# Altium footprint library 连接插件.PcbLib: 93 footprints (part 5 of 6)
Each footprint in its own frame and in the unit in brackets; x right, y up, seen from the top. Pads: shape width x height; smd on the part's side, far side on the other; paste and mask are expansions set on the pad; w line width, h text height; cw(c..) or ccw(c..) is an arc to the next point about the centre after c.
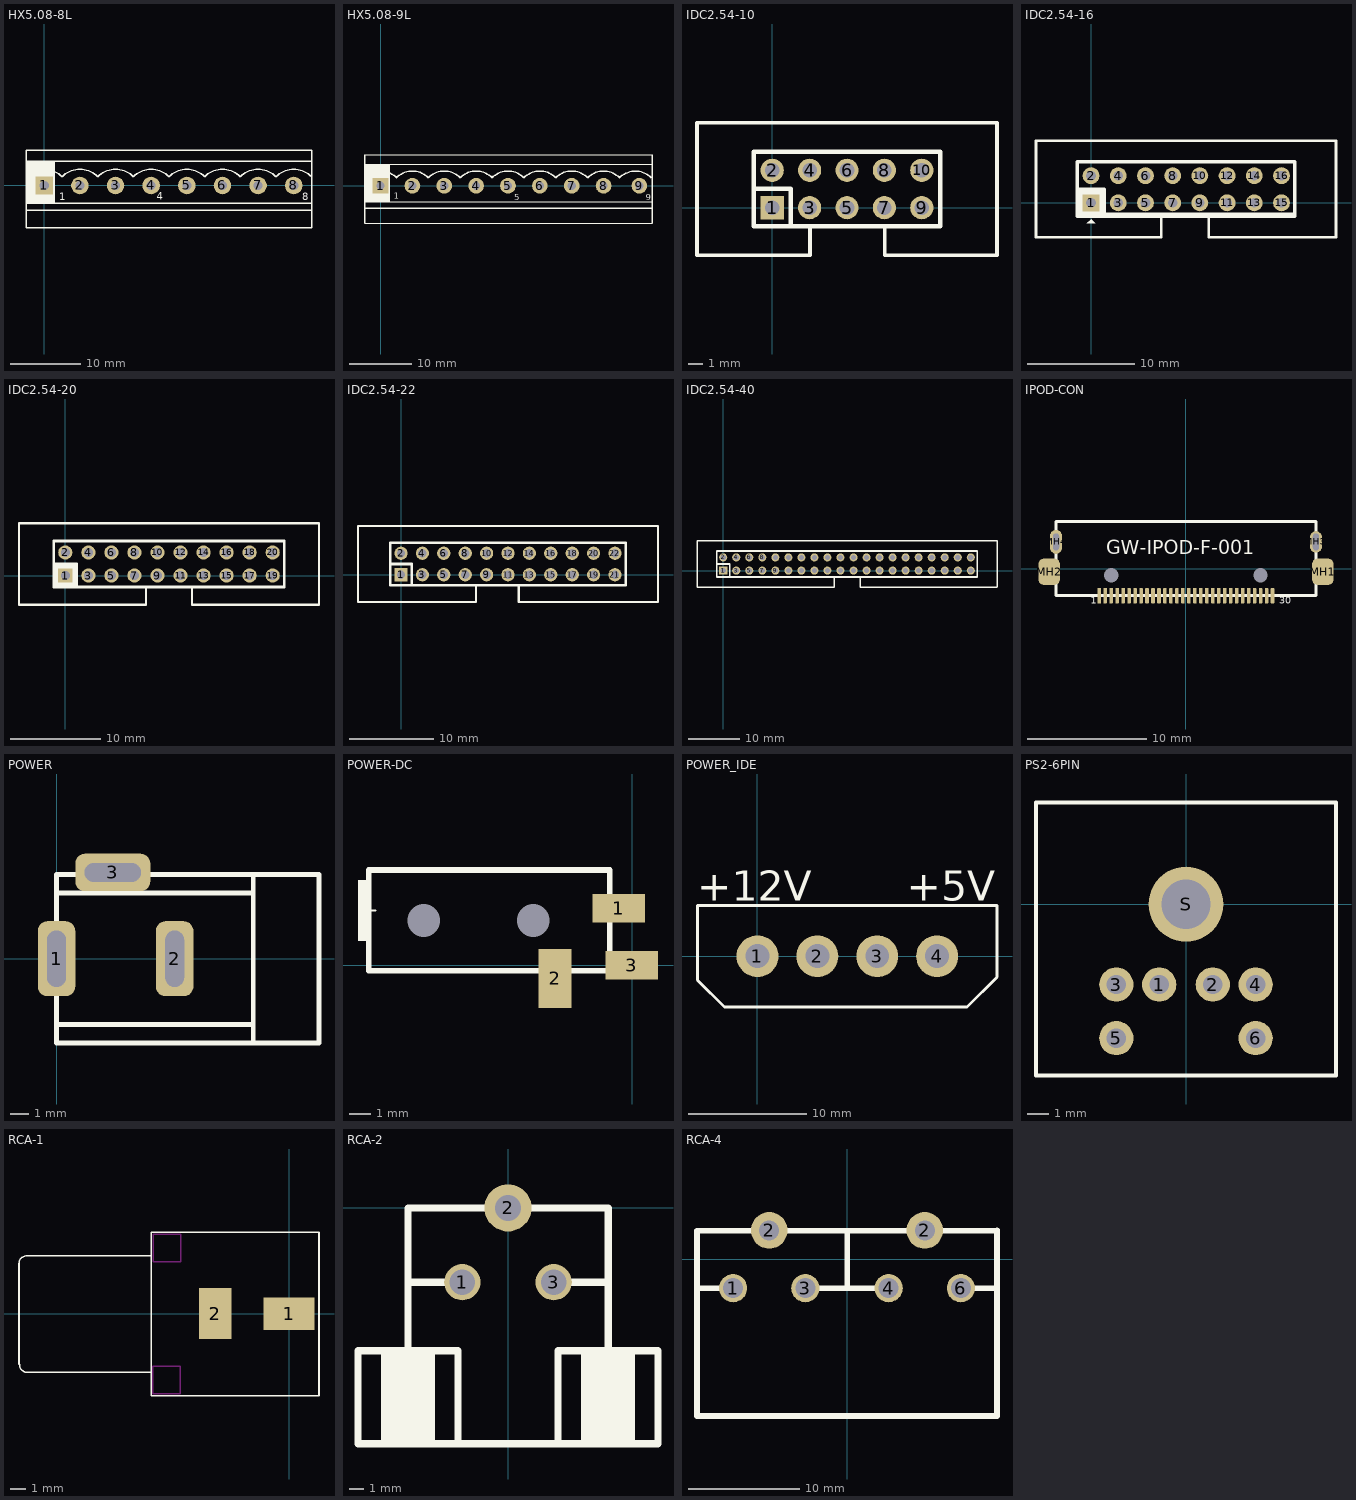
[diagram p4: the footprints below, top view; thin cyan lines are the x and y axes]

## HX5.08-8L [mm]
pads (8):
  rect 2.5x2.5 hole 1.3: 1(0,0)
  round 2.5 hole 1.3: 2(5.08,0) 3(10.16,0) 4(15.24,0) 5(20.32,0) 6(25.4,0) 7(30.48,0) 8(35.56,0)
Top Overlay:
  rectangle: -2.54,-2.54 1.524,3.429
  lines w0.203: -2.544,1.274 cw(c0,-1.27) 2.544,1.274 ; -2.54,-3.556 38.1,-3.556 ; -2.54,-2.54 38.1,-2.54 ; -2.54,3.429 38.1,3.429 ; 2.536,1.274 cw(c5.08,-1.27) 7.624,1.274 ; 7.616,1.274 cw(c10.16,-1.27) 12.704,1.274 ; 12.696,1.274 cw(c15.24,-1.27) 17.784,1.274 ; 17.776,1.274 cw(c20.32,-1.27) 22.864,1.274 ; 22.856,1.274 cw(c25.4,-1.27) 27.944,1.274 ; 27.936,1.274 cw(c30.48,-1.27) 33.024,1.274 ; 33.016,1.274 cw(c35.56,-1.27) 38.104,1.274 ; -2.54,-6 38.1,-6 38.1,5 -2.54,5 -2.54,-6
  text "8" at 36.779,-2.083 h1.02
  text "4" at 16.053,-2.032 h1.02
  text "1" at 2.108,-2.108 h1.02
3D body "050-8.step": height 11, standoff -2, extent -2.5,-5.5 37.5,2.5

## HX5.08-9L [mm]
pads (9):
  rect 2.5x2.5 hole 1.3: 1(0,0)
  round 2.5 hole 1.3: 2(5.08,0) 3(10.16,0) 4(15.24,0) 5(20.32,0) 6(25.4,0) 7(30.48,0) 8(35.56,0) 9(41.275,0)
Top Overlay:
  rectangle: -2.54,-2.54 1.524,3.429
  lines w0.154: -2.54,-6 43.276,-6 43.307,-5.969 ; -2.54,-2.54 43.307,-2.54 ; -2.54,3.429 43.307,3.429 ; -2.54,4.953 43.307,4.953
  lines w0.203: -2.544,1.274 cw(c0,-1.27) 2.544,1.274 ; -2.54,-6 -2.54,4.953 ; -2.54,-3.556 43.307,-3.556 ; 2.536,1.274 cw(c5.08,-1.27) 7.624,1.274 ; 7.616,1.274 cw(c10.16,-1.27) 12.704,1.274 ; 12.696,1.274 cw(c15.24,-1.27) 17.784,1.274 ; 17.776,1.274 cw(c20.32,-1.27) 22.864,1.274 ; 22.856,1.274 cw(c25.4,-1.27) 27.944,1.274 ; 27.936,1.274 cw(c30.48,-1.27) 33.024,1.274 ; 33.016,1.274 cw(c35.56,-1.27) 38.104,1.274 ; 38.1,1.27 cw(c40.644,-1.274) 43.189,1.27 ; 43.307,-5.969 43.307,4.953
  text "9" at 42.291,-2.286 h1.02
  text "1" at 2.108,-2.108 h1.02
  text "5" at 21.336,-2.286 h1.02
3D body "050-9.STEP": height 11, standoff -2, extent -2.5,-5.5 42.5,2.5

## IDC2.54-10 [mil]
pads (10):
  rect 62x62 hole 39.37: 1(0,0)
  round 62 hole 39.37: 2(0,100) 3(100,0) 4(100,100) 5(200,0) 6(200,100) 7(300,0) 8(300,100) 9(400,0) 10(400,100)
Top Overlay:
  lines w10: 101,-50 101,-127.17 -201.18,-127.17 -201.18,227.16 601.18,227.16 ; 301,-50 301,-127.17 601.18,-127.17 ; 601,-127.33 601,227
  lines w12: -50,50 50,50 50,-50 ; -50,-50 -50,150 450,150 450,-50 -50,-50
3D body "SW3dPS-HDB-10.STEP": height 366.14, standoff -98.43, extent -196.64,-128.08 598.64,242

## IDC2.54-16 [mil]
pads (16):
  rect 62x62 hole 35.43: 1(0,0)
  round 62 hole 35.43: 2(0,100) 3(100,0) 4(100,100) 5(200,0) 6(200,100) 7(300,0) 8(300,100) 9(400,0) 10(400,100) 11(500,0) 12(500,100) 13(600,0) 14(600,100) 15(700,0) 16(700,100)
Top Overlay:
  rectangle: -51,-49 48,53
  region: -15,-75 15,-75 0,-60
  lines w7.87: -50,-40 750,-40
  lines w10: 258,-49 258,-126.17 -202.18,-126.17 -202.18,228.16 900.18,228.16 900.18,-126.17 433,-126.17 433,-49
  lines w12: -51,51 49,51 49,-49 ; -51,-49 -51,151 749,151 749,-49 -51,-49

## IDC2.54-20 [mil]
pads (20):
  rect 62x62 hole 39.37: 1(0,0)
  round 62 hole 39.37: 2(0,100) 3(100,0) 4(100,100) 5(200,0) 6(200,100) 7(300,0) 8(300,100) 9(400,0) 10(400,100) 11(500,0) 12(500,100) 13(600,0) 14(600,100) 15(700,0) 16(700,100) 17(800,0) 18(800,100) 19(900,0) 20(900,100)
Top Overlay:
  rectangle: -50,-50 49,52
  lines w10: 350,-50 350,-127.17 -201.18,-127.17 -201.18,227.16 1101.18,227.16 1101.18,-127.17 550,-127.17 550,-50
  lines w12: -50,50 50,50 50,-50 ; -50,-50 -50,150 950,150 950,-50 -50,-50
3D body "SW3dPS-BH-20.STEP": height 352.36, standoff -114.17, extent -201,-123.27 1099,235

## IDC2.54-22 [mil]
pads (22):
  rect 62x62 hole 39.37: 1(0,0)
  round 62 hole 39.37: 2(0,100) 3(100,0) 4(100,100) 5(200,0) 6(200,100) 7(300,0) 8(300,100) 9(400,0) 10(400,100) 11(500,0) 12(500,100) 13(600,0) 14(600,100) 15(700,0) 16(700,100) 17(800,0) 18(800,100) 19(900,0) 20(900,100) 21(1000,0) 22(1000,100)
Top Overlay:
  lines w10: 350,-50 350,-127.17 -201.18,-127.17 -201.18,227.16 1201.18,227.16 1201.18,-127.17 550,-127.17 550,-50
  lines w12: -50,50 50,50 50,-50 ; -50,-50 1050,-50 1050,150 -50,150 -50,-50

## IDC2.54-40 [mil]
pads (40):
  rect 62x62 hole 39.37: 1(0,0)
  round 62 hole 39.37: 2(0,100) 3(100,0) 4(100,100) 5(200,0) 6(200,100) 7(300,0) 8(300,100) 9(400,0) 10(400,100) 11(500,0) 12(500,100) 13(600,0) 14(600,100) 15(700,0) 16(700,100) 17(800,0) 18(800,100) 19(900,0) 20(900,100) 21(1000,0) 22(1000,100) 23(1100,0) 24(1100,100) 25(1200,0) 26(1200,100) 27(1300,0) 28(1300,100) 29(1400,0) 30(1400,100) 31(1500,0) 32(1500,100) 33(1600,0) 34(1600,100) 35(1700,0) 36(1700,100) 37(1800,0) 38(1800,100) 39(1900,0) 40(1900,100)
Top Overlay:
  lines w10: 851,-50 851,-127.17 -201.18,-127.17 -201.18,227.16 2101.18,227.16 2101.18,-127.17 ; 1051,-50 1051,-127.17 2101,-127.17
  lines w12: -50,50 50,50 50,-50 ; 1948,-50 -50,-50 -50,150 1950,150 ; 1950,50 1950,-50 ; 1950,-50 1950,150 ; 1950,-50 1950,150
3D body "SW3dPS-HDB-40.STEP": height 366.14, standoff -98.43, extent -196.64,-126.08 2098.64,244

## IPOD-CON [mm]
height 2.5
pads (36):
  rect 0.3x1.3 smd: 1(-7.261,-2.25)
  rrect50% 0.3x1.3 smd: 2(-6.761,-2.25) 3(-6.261,-2.25) 4(-5.761,-2.25) 5(-5.261,-2.25) 6(-4.761,-2.25) 7(-4.261,-2.25) 8(-3.761,-2.25) 9(-3.261,-2.25) 10(-2.761,-2.25) 11(-2.261,-2.25) 12(-1.761,-2.25) 13(-1.261,-2.25) 14(-0.761,-2.25) 15(-0.261,-2.25) 16(0.239,-2.25) 17(0.739,-2.25) 18(1.239,-2.25) 19(1.739,-2.25) 20(2.239,-2.25) 21(2.739,-2.25) 22(3.239,-2.25) 23(3.739,-2.25) 24(4.239,-2.25) 25(4.739,-2.25) 26(5.239,-2.25) 27(5.739,-2.25) 28(6.239,-2.25) 29(6.739,-2.25) 30(7.239,-2.25)
  rrect50% 1.8x2.2 smd: MH1(11.45,-0.25) MH2(-11.45,-0.25)
  oval 1x1.8 hole 0.5 slot 1.4 at 90 deg: MH3(10.875,2.25)
  oval 1x2 hole 0.5 slot 1.4 at 90 deg: MH4(-10.875,2.25)
  rrect50% 0.3x0 hole 1.2: ""(-6.261,-0.55) ""(6.239,-0.55)
Top Overlay:
  lines w0.254: -10.875,-2.25 -10.875,3.95 10.875,3.95 10.875,-2.25 -10.875,-2.25
  text "GW-IPOD-F-001" at -6.655,0.813 h2
  text "30" at 7.798,-3.15 h1
  text "1" at -7.95,-3.15 h1
3D body "User Library-dock_connector.STEP": height 2.2, standoff 0, extent -11.409,-1.968 11.308,3.632

## PCBComponent_1 [mm]

## POWER [mm]
pads (3):
  rrect50% 2x4 hole 1 slot 3 at 90 deg: 1(0,0) 2(6.3,0)
  rrect50% 4x2 hole 1 slot 3 at 0 deg: 3(3,4.6)
Top Overlay:
  lines w0.254: 0,-3.505 10.49,-3.505 ; 0,3.505 10.49,3.505 ; 10.49,-4.496 10.49,4.496 ; 0,-4.496 13.995,-4.496 13.995,4.496 0,4.496 0,-4.496
3D body "User Library-dc range - dc connector[4840_2201].STEP": height 11.02, standoff -3.48, extent -0.043,-4.503 13.783,5.003

## POWER-DC [mm]
pads (5):
  round 0 hole 1.5 mask+0: 0(-9.521,2.057) 0(-4.521,2.057)
  rect 2.4x1.3 smd: 1(-0.621,2.607) 3(-0.021,0.007)
  rect 1.5x2.7 smd: 2(-3.521,-0.593)
Top Overlay:
  rectangle: -12.521,1.107 -11.921,3.907
  lines w0.1: -12.221,2.507 -11.721,2.507
  lines w0.254: -12.021,-0.243 -1.021,-0.243 -1.021,4.357 -12.021,4.357 -12.021,-0.243
3D body "DC.STEP": height 4.4, standoff -0.8, extent -11.996,-1.818 0.604,4.482

## POWER_IDE [mil]
pads (4):
  round 140 hole 80: 1(0,0) 2(200,0) 3(400,0) 4(600,0)
Top Overlay:
  lines w10: 640,-170 700,-170 ; 800,-40 800,-70 ; 700,-170 -110,-170 -200,-80 -200,170 800,170 800,-70 ; 700,-170 800,-70
  text "+5V" at 498,185 h100
  text "+12V" at -202,185 h100
3D body "SW3dPS-Molex disk drive power connector.STEP": height 480, standoff 0, extent -158,-174 762,176

## PS2-6PIN [mm] "PS2 Socket, 6 Pin, Through Hole"
pads (7):
  round 1.6 hole 0.9: 1(-1.25,-3.75) 2(1.25,-3.75) 3(-3.25,-3.75) 4(3.25,-3.75) 5(-3.25,-6.25) 6(3.25,-6.25)
  round 3.5 hole 2.3: S(0,0)
Top Overlay:
  lines w0.2: -7,-8 -7,4.75 7,4.75 7,-8 -7,-8

## RCA-1 [mm]
pads (2):
  rect 3.3x2.1 all layers, no hole: 1(0,0)
  rect 2.1x3.3 all layers, no hole: 2(-4.75,0)
Top Overlay:
  lines w0.1: -17.383,-3.242 -17.383,3.225 cw(c-16.883,3.225) -16.875,3.725 -8.875,3.725 ; -17.35,-3.275 ccw(c-16.85,-3.283) -16.85,-3.783 ; -16.875,-3.775 -8.875,-3.775 ; -8.875,-5.275 1.925,-5.275 1.925,5.225 -8.875,5.225 -8.875,-5.275
Keep-Out Layer:
  lines w0.1: -8.775,-5.125 -8.775,-3.375 -7,-3.375 -7,-5.15 -8.75,-5.15 -8.775,-5.125 ; -8.75,3.325 -6.975,3.325 -6.975,5.1 -8.75,5.1 -8.75,3.325
Mechanical 1:
  lines w0.1: -5.375,-1.225 -5.375,1.175 -4.175,1.175 -4.175,-1.225 -5.375,-1.225 ; -1.175,-0.625 1.225,-0.625 1.225,0.575 -1.175,0.575 -1.175,-0.625
3D body "CUI-DEFAULT.STEP": height 11.86, standoff -3.64, extent -17.628,-5 1.872,5

## RCA-2 [mm]
pads (3):
  round 2.54 hole 1.8: 1(-3.2,-5.2) 3(3.2,-5.2)
  round 3.3 hole 1.8: 2(0,0)
Top Overlay:
  rectangle: 5.283,-16.5 8.738,-10
  rectangle: -8.738,-16.5 -5.309,-10
  lines w0.254: -8.75,-16.5 -8.75,-10 ; -5.25,-16.5 -5.25,-10 ; 5.25,-16.5 5.25,-10 ; 8.75,-16.5 8.75,-10
  lines w0.508: -7,-5.2 -3.25,-5.2 ; -3.5,-16.5 -3.5,-10 -7,-10 -10.5,-10 -10.5,-16.5 -7,-16.5 ; 3.19,-5.2 7,-5.2 ; 3.5,-16.5 3.5,-10 7,-10 10.5,-10 10.5,-16.5 7.017,-16.5 7.017,0 ; 7,-16.5 -7,-16.5 ; 7,0 -7,0 -7,-16.5
3D body "CUI-RCJ-2273.STEP": height 28.01, standoff -4.39, extent -8.371,-19.634 12.029,0.166

## RCA-4 [mm]
pads (6):
  round 2.54 hole 1.8: 1(-10.25,-2.6) 3(-3.75,-2.6) 4(3.75,-2.6) 6(10.25,-2.6)
  round 3.3 hole 1.8: 2(-7,2.6) 2(7,2.6)
Top Overlay:
  lines w0.508: -13.483,-2.6 -10.25,-2.6 ; -3.81,-2.6 3.81,-2.6 ; 0.017,-2.505 0.017,2.575 ; 10.25,-2.6 13.467,-2.6 ; 12.971,2.575 13.479,2.575 ; 13.5,2.575 -13.5,2.575 -13.5,-14.1 13.5,-14.1 13.5,2.6
3D body "CUI-RCJ-411234.STEP": height 27.31, standoff -5.59, extent -17.324,-17.231 17.476,2.819